# Altium footprint library Package_SO.PcbLib: 333 footprints (part 6 of 21)
Each footprint in its own frame and in the unit in brackets; x right, y up, seen from the top. Pads: shape width x height; smd on the part's side, far side on the other; paste and mask are expansions set on the pad; w line width, h text height; cw(c..) or ccw(c..) is an arc to the next point about the centre after c.
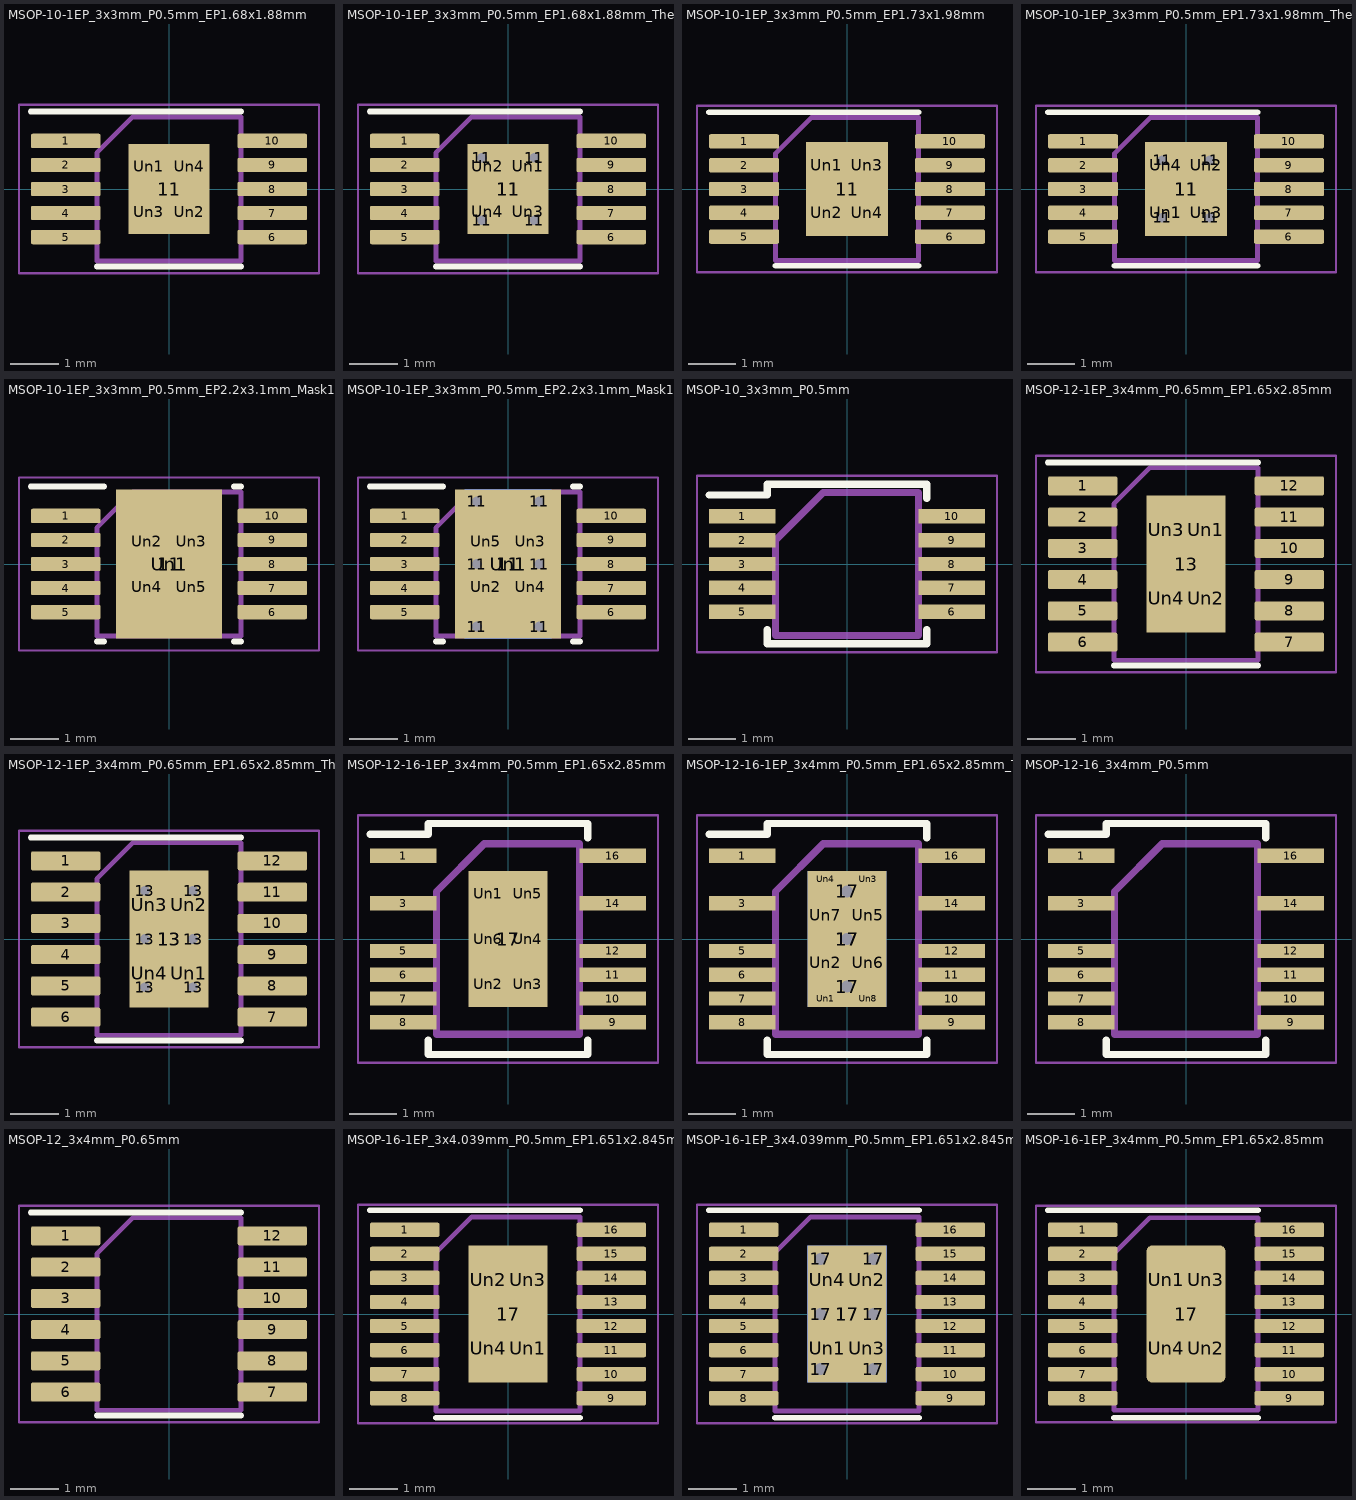
[diagram p5: the footprints below, top view; thin cyan lines are the x and y axes]

## MSOP-10-1EP_3x3mm_P0.5mm_EP1.68x1.88mm [mm]
pads (15):
  rrect25% 1.45x0.3 smd: 1(-2.15,1) 2(-2.15,0.5) 3(-2.15,0) 4(-2.15,-0.5) 5(-2.15,-1) 6(2.15,-1) 7(2.15,-0.5) 8(2.15,0) 9(2.15,0.5) 10(2.15,1)
  rect 1.68x1.88 smd: 11(0,0)
  rrect25% 0.68x0.76 on Top Paste: Un1(-0.42,0.47) Un2(0.42,-0.47) Un3(-0.42,-0.47) Un4(0.42,0.47)
F.SilkS:
  lines w0.12: -2.875,1.61 0,1.61 1.5,1.61 ; -1.5,-1.61 0,-1.61 1.5,-1.61
F.CrtYd:
  lines w0.05: -3.12,-1.75 -3.12,1.75 3.12,1.75 3.12,-1.75 -3.12,-1.75
F.Fab:
  lines w0.1: -1.5,-1.5 -1.5,0.75 -0.75,1.5 1.5,1.5 1.5,-1.5 -1.5,-1.5
  text "'.Designator'" at -3.033,-0.628 h0.75

## MSOP-10-1EP_3x3mm_P0.5mm_EP1.68x1.88mm_ThermalVias [mm]
pads (20):
  rrect25% 1.45x0.3 smd: 1(-2.15,1) 2(-2.15,0.5) 3(-2.15,0) 4(-2.15,-0.5) 5(-2.15,-1) 6(2.15,-1) 7(2.15,-0.5) 8(2.15,0) 9(2.15,0.5) 10(2.15,1)
  round 0.5 hole 0.2: 11(-0.55,-0.65) 11(-0.55,0.65) 11(0.55,-0.65) 11(0.55,0.65)
  rect 1.68x1.88 smd: 11(0,0)
  rect 1.6x1.8 smd far side: 11(0,0)
  rrect25% 0.7x0.79 on Top Paste: Un1(0.42,0.47) Un2(-0.42,0.47) Un3(0.42,-0.47) Un4(-0.42,-0.47)
F.SilkS:
  lines w0.12: -2.875,1.61 0,1.61 1.5,1.61 ; -1.5,-1.61 0,-1.61 1.5,-1.61
F.CrtYd:
  lines w0.05: -3.12,-1.75 3.12,-1.75 3.12,1.75 -3.12,1.75 -3.12,-1.75
F.Fab:
  lines w0.1: -1.5,-1.5 1.5,-1.5 1.5,1.5 -0.75,1.5 -1.5,0.75 -1.5,-1.5
  text "'.Designator'" at -3.033,-0.628 h0.75

## MSOP-10-1EP_3x3mm_P0.5mm_EP1.73x1.98mm [mm]
pads (15):
  rrect25% 1.475x0.3 smd: 1(-2.163,1) 2(-2.163,0.5) 3(-2.163,0) 4(-2.163,-0.5) 5(-2.163,-1) 6(2.163,-1) 7(2.163,-0.5) 8(2.163,0) 9(2.163,0.5) 10(2.163,1)
  rect 1.73x1.98 smd: 11(0,0)
  rrect25% 0.7x0.8 on Top Paste: Un1(-0.43,0.495) Un2(-0.43,-0.495) Un3(0.43,0.495) Un4(0.43,-0.495)
F.SilkS:
  lines w0.12: -2.9,1.61 0,1.61 1.5,1.61 ; -1.5,-1.61 0,-1.61 1.5,-1.61
F.CrtYd:
  lines w0.05: -3.15,-1.75 3.15,-1.75 3.15,1.75 -3.15,1.75 -3.15,-1.75
F.Fab:
  lines w0.1: -1.5,-1.5 1.5,-1.5 1.5,1.5 -0.75,1.5 -1.5,0.75 -1.5,-1.5
  text "'.Designator'" at -3.033,-0.628 h0.75

## MSOP-10-1EP_3x3mm_P0.5mm_EP1.73x1.98mm_ThermalVias [mm]
pads (20):
  rrect25% 1.475x0.3 smd: 1(-2.163,1) 2(-2.163,0.5) 3(-2.163,0) 4(-2.163,-0.5) 5(-2.163,-1) 6(2.163,-1) 7(2.163,-0.5) 8(2.163,0) 9(2.163,0.5) 10(2.163,1)
  round 0.5 hole 0.2: 11(-0.5,-0.6) 11(-0.5,0.6) 11(0.5,-0.6) 11(0.5,0.6)
  rect 1.5x1.7 smd far side: 11(0,0)
  rect 1.73x1.98 smd: 11(0,0)
  rrect25% 0.72x0.83 on Top Paste: Un1(-0.43,-0.495) Un2(0.43,0.495) Un3(0.43,-0.495) Un4(-0.43,0.495)
F.SilkS:
  lines w0.12: -2.9,1.61 0,1.61 1.5,1.61 ; -1.5,-1.61 0,-1.61 1.5,-1.61
F.CrtYd:
  lines w0.05: -3.15,-1.75 -3.15,1.75 3.15,1.75 3.15,-1.75 -3.15,-1.75
F.Fab:
  lines w0.1: -1.5,-1.5 1.5,-1.5 1.5,1.5 -0.75,1.5 -1.5,0.75 -1.5,-1.5
  text "'.Designator'" at -3.033,-0.628 h0.75

## MSOP-10-1EP_3x3mm_P0.5mm_EP2.2x3.1mm_Mask1.83x1.89mm [mm]
pads (16):
  rrect25% 1.45x0.3 smd: 1(-2.15,1) 2(-2.15,0.5) 3(-2.15,0) 4(-2.15,-0.5) 5(-2.15,-1) 6(2.15,-1) 7(2.15,-0.5) 8(2.15,0) 9(2.15,0.5) 10(2.15,1)
  rect 2.2x3.1 smd: 11(0,0)
  rect 1.83x1.89 on Top Solder: Un1(0,0)
  rrect25% 0.74x0.76 on Top Paste: Un2(-0.46,0.47) Un3(0.46,0.47) Un4(-0.46,-0.47) Un5(0.46,-0.47)
F.SilkS:
  lines w0.12: -2.875,1.61 -1.353,1.61 ; -1.5,-1.61 -1.353,-1.61 ; 1.353,-1.61 1.5,-1.61 ; 1.353,1.61 1.5,1.61
F.CrtYd:
  lines w0.05: -3.12,-1.8 -3.12,1.8 3.12,1.8 3.12,-1.8 -3.12,-1.8
F.Fab:
  lines w0.1: -1.5,-1.5 1.5,-1.5 1.5,1.5 -0.75,1.5 -1.5,0.75 -1.5,-1.5
  text "'.Designator'" at -3.033,-0.628 h0.75

## MSOP-10-1EP_3x3mm_P0.5mm_EP2.2x3.1mm_Mask1.83x1.89mm_ThermalVias [mm]
pads (23):
  rrect25% 1.45x0.3 smd: 1(-2.15,1) 2(-2.15,0.5) 3(-2.15,0) 4(-2.15,-0.5) 5(-2.15,-1) 6(2.15,-1) 7(2.15,-0.5) 8(2.15,0) 9(2.15,0.5) 10(2.15,1)
  round 0.5 hole 0.2: 11(-0.65,-1.3) 11(-0.65,0) 11(-0.65,1.3) 11(0.65,-1.3) 11(0.65,0) 11(0.65,1.3)
  rect 1.8x3.1 smd far side: 11(0,0)
  rect 2.2x3.1 smd: 11(0,0)
  rect 1.83x1.89 on Top Solder: Un1(0,0)
  rrect25% 0.74x0.76 on Top Paste: Un2(-0.46,-0.47) Un3(0.46,0.47) Un4(0.46,-0.47) Un5(-0.46,0.47)
F.SilkS:
  lines w0.12: -2.875,1.61 -1.353,1.61 ; -1.5,-1.61 -1.353,-1.61 ; 1.353,-1.61 1.5,-1.61 ; 1.353,1.61 1.5,1.61
F.CrtYd:
  lines w0.05: -3.12,-1.8 3.12,-1.8 3.12,1.8 -3.12,1.8 -3.12,-1.8
F.Fab:
  lines w0.1: -1.5,-1.5 -1.5,0.75 -0.75,1.5 1.5,1.5 1.5,-1.5 -1.5,-1.5
  text "'.Designator'" at -3.033,-0.628 h0.75

## MSOP-10_3x3mm_P0.5mm [mm]
pads (10):
  rect 1.4x0.3 smd: 1(-2.2,1) 2(-2.2,0.5) 3(-2.2,0) 4(-2.2,-0.5) 5(-2.2,-1) 6(2.2,-1) 7(2.2,-0.5) 8(2.2,0) 9(2.2,0.5) 10(2.2,1)
F.SilkS:
  lines w0.15: -2.9,1.45 -1.675,1.45 -1.675,1.675 1.675,1.675 1.675,1.375 ; -1.675,-1.375 -1.675,-1.675 1.675,-1.675 1.675,-1.375
F.CrtYd:
  lines w0.05: -3.15,-1.85 -3.15,1.85 3.15,1.85 3.15,-1.85 -3.15,-1.85
F.Fab:
  lines w0.15: -1.5,-1.5 1.5,-1.5 1.5,1.5 -0.5,1.5 -1.5,0.5 -1.5,-1.5
  text "'.Designator'" at -2.488,-0.564 h0.6

## MSOP-12-1EP_3x4mm_P0.65mm_EP1.65x2.85mm [mm]
pads (17):
  rrect25% 1.45x0.4 smd: 1(-2.15,1.625) 2(-2.15,0.975) 3(-2.15,0.325) 4(-2.15,-0.325) 5(-2.15,-0.975) 6(-2.15,-1.625) 7(2.15,-1.625) 8(2.15,-0.975) 9(2.15,-0.325) 10(2.15,0.325) 11(2.15,0.975) 12(2.15,1.625)
  rect 1.65x2.85 smd: 13(0,0)
  rrect25% 0.67x1.15 on Top Paste: Un1(0.41,0.71) Un2(0.41,-0.71) Un3(-0.41,0.71) Un4(-0.41,-0.71)
F.SilkS:
  lines w0.12: -2.875,2.11 0,2.11 1.5,2.11 ; -1.5,-2.11 0,-2.11 1.5,-2.11
F.CrtYd:
  lines w0.05: -3.12,-2.25 3.12,-2.25 3.12,2.25 -3.12,2.25 -3.12,-2.25
F.Fab:
  lines w0.1: -1.5,-2 1.5,-2 1.5,2 -0.75,2 -1.5,1.25 -1.5,-2
  text "'.Designator'" at -3.033,-0.628 h0.75

## MSOP-12-1EP_3x4mm_P0.65mm_EP1.65x2.85mm_ThermalVias [mm]
pads (24):
  rrect25% 1.45x0.4 smd: 1(-2.15,1.625) 2(-2.15,0.975) 3(-2.15,0.325) 4(-2.15,-0.325) 5(-2.15,-0.975) 6(-2.15,-1.625) 7(2.15,-1.625) 8(2.15,-0.975) 9(2.15,-0.325) 10(2.15,0.325) 11(2.15,0.975) 12(2.15,1.625)
  round 0.5 hole 0.2: 13(-0.5,-1) 13(-0.5,0) 13(-0.5,1) 13(0.5,-1) 13(0.5,0) 13(0.5,1)
  rect 1.5x2.5 smd far side: 13(0,0)
  rect 1.65x2.85 smd: 13(0,0)
  rrect25% 0.69x1.19 on Top Paste: Un1(0.41,-0.71) Un2(0.41,0.71) Un3(-0.41,0.71) Un4(-0.41,-0.71)
F.SilkS:
  lines w0.12: -2.875,2.11 0,2.11 1.5,2.11 ; -1.5,-2.11 0,-2.11 1.5,-2.11
F.CrtYd:
  lines w0.05: -3.12,-2.25 3.12,-2.25 3.12,2.25 -3.12,2.25 -3.12,-2.25
F.Fab:
  lines w0.1: -1.5,-2 1.5,-2 1.5,2 -0.75,2 -1.5,1.25 -1.5,-2
  text "'.Designator'" at -3.033,-0.628 h0.75

## MSOP-12-16-1EP_3x4mm_P0.5mm_EP1.65x2.85mm [mm]
pads (19):
  rect 1.4x0.3 smd: 1(-2.2,1.75) 3(-2.2,0.75) 5(-2.2,-0.25) 6(-2.2,-0.75) 7(-2.2,-1.25) 8(-2.2,-1.75) 9(2.2,-1.75) 10(2.2,-1.25) 11(2.2,-0.75) 12(2.2,-0.25) 14(2.2,0.75) 16(2.2,1.75)
  rect 1.65x2.85 smd: 17(0,0)
  rect 0.66x0.75 on Top Paste: Un1(-0.413,0.95) Un2(-0.413,-0.95) Un3(0.413,-0.95) Un4(0.413,0) Un5(0.413,0.95) Un6(-0.413,0)
F.SilkS:
  lines w0.15: -2.9,2.2 -1.675,2.2 -1.675,2.425 1.675,2.425 1.675,2.125 ; -1.675,-2.125 -1.675,-2.425 1.675,-2.425 1.675,-2.125
F.CrtYd:
  lines w0.05: -3.15,-2.6 -3.15,2.6 3.15,2.6 3.15,-2.6 -3.15,-2.6
F.Fab:
  lines w0.15: -1.5,-2 -1.5,1 -0.5,2 1.5,2 1.5,-2 -1.5,-2
  text "'.Designator'" at -2.428,-0.504 h0.6

## MSOP-12-16-1EP_3x4mm_P0.5mm_EP1.65x2.85mm_ThermalVias [mm]
pads (25):
  rect 1.4x0.3 smd: 1(-2.2,1.75) 3(-2.2,0.75) 5(-2.2,-0.25) 6(-2.2,-0.75) 7(-2.2,-1.25) 8(-2.2,-1.75) 9(2.2,-1.75) 10(2.2,-1.25) 11(2.2,-0.75) 12(2.2,-0.25) 14(2.2,0.75) 16(2.2,1.75)
  round 0.65 hole 0.25: 17(0,-1) 17(0,0) 17(0,1)
  rect 1.65x2.85 smd far side: 17(0,0)
  rect 1.65x2.85 smd: 17(0,0)
  rect 0.65x0.25 on Top Paste: Un1(-0.45,-1.25) Un3(0.45,1.25) Un4(-0.45,1.25) Un8(0.45,-1.25)
  rect 0.65x0.8 on Top Paste: Un2(-0.45,-0.5) Un5(0.45,0.5) Un6(0.45,-0.5) Un7(-0.45,0.5)
F.SilkS:
  lines w0.15: -2.9,2.2 -1.675,2.2 -1.675,2.425 1.675,2.425 1.675,2.125 ; -1.675,-2.125 -1.675,-2.425 1.675,-2.425 1.675,-2.125
F.CrtYd:
  lines w0.05: -3.15,-2.6 3.15,-2.6 3.15,2.6 -3.15,2.6 -3.15,-2.6
F.Fab:
  lines w0.15: -1.5,-2 1.5,-2 1.5,2 -0.5,2 -1.5,1 -1.5,-2
  text "'.Designator'" at -2.428,-0.504 h0.6

## MSOP-12-16_3x4mm_P0.5mm [mm]
pads (12):
  rect 1.4x0.3 smd: 1(-2.2,1.75) 3(-2.2,0.75) 5(-2.2,-0.25) 6(-2.2,-0.75) 7(-2.2,-1.25) 8(-2.2,-1.75) 9(2.2,-1.75) 10(2.2,-1.25) 11(2.2,-0.75) 12(2.2,-0.25) 14(2.2,0.75) 16(2.2,1.75)
F.SilkS:
  lines w0.15: -2.9,2.2 -1.675,2.2 -1.675,2.425 1.675,2.425 1.675,2.125 ; -1.675,-2.125 -1.675,-2.425 1.675,-2.425 1.675,-2.125
F.CrtYd:
  lines w0.05: -3.15,-2.6 -3.15,2.6 3.15,2.6 3.15,-2.6 -3.15,-2.6
F.Fab:
  lines w0.15: -1.5,-2 -1.5,1 -0.5,2 1.5,2 1.5,-2 -1.5,-2
  text "'.Designator'" at -2.488,-0.564 h0.6

## MSOP-12_3x4mm_P0.65mm [mm]
pads (12):
  rrect25% 1.45x0.4 smd: 1(-2.15,1.625) 2(-2.15,0.975) 3(-2.15,0.325) 4(-2.15,-0.325) 5(-2.15,-0.975) 6(-2.15,-1.625) 7(2.15,-1.625) 8(2.15,-0.975) 9(2.15,-0.325) 10(2.15,0.325) 11(2.15,0.975) 12(2.15,1.625)
F.SilkS:
  lines w0.12: -2.875,2.11 0,2.11 1.5,2.11 ; -1.5,-2.11 0,-2.11 1.5,-2.11
F.CrtYd:
  lines w0.05: -3.12,-2.25 3.12,-2.25 3.12,2.25 -3.12,2.25 -3.12,-2.25
F.Fab:
  lines w0.1: -1.5,-2 1.5,-2 1.5,2 -0.75,2 -1.5,1.25 -1.5,-2
  text "'.Designator'" at -3.033,-0.628 h0.75

## MSOP-16-1EP_3x4.039mm_P0.5mm_EP1.651x2.845mm [mm]
pads (21):
  rrect25% 1.45x0.3 smd: 1(-2.15,1.75) 2(-2.15,1.25) 3(-2.15,0.75) 4(-2.15,0.25) 5(-2.15,-0.25) 6(-2.15,-0.75) 7(-2.15,-1.25) 8(-2.15,-1.75) 9(2.15,-1.75) 10(2.15,-1.25) 11(2.15,-0.75) 12(2.15,-0.25) 13(2.15,0.25) 14(2.15,0.75) 15(2.15,1.25) 16(2.15,1.75)
  rect 1.651x2.845 smd: 17(0,0)
  rrect25% 0.69x1.19 on Top Paste: Un1(0.415,-0.71) Un2(-0.415,0.71) Un3(0.415,0.71) Un4(-0.415,-0.71)
F.SilkS:
  lines w0.12: -2.875,2.16 0,2.16 1.5,2.16 ; -1.5,-2.16 0,-2.16 1.5,-2.16
F.CrtYd:
  lines w0.05: -3.12,-2.27 3.12,-2.27 3.12,2.27 -3.12,2.27 -3.12,-2.27
F.Fab:
  lines w0.1: -1.5,-2.02 1.5,-2.02 1.5,2.02 -0.75,2.02 -1.5,1.269 -1.5,-2.02
  text "'.Designator'" at -3.033,-0.628 h0.75

## MSOP-16-1EP_3x4.039mm_P0.5mm_EP1.651x2.845mm_ThermalVias [mm]
pads (28):
  rrect25% 1.45x0.3 smd: 1(-2.15,1.75) 2(-2.15,1.25) 3(-2.15,0.75) 4(-2.15,0.25) 5(-2.15,-0.25) 6(-2.15,-0.75) 7(-2.15,-1.25) 8(-2.15,-1.75) 9(2.15,-1.75) 10(2.15,-1.25) 11(2.15,-0.75) 12(2.15,-0.25) 13(2.15,0.25) 14(2.15,0.75) 15(2.15,1.25) 16(2.15,1.75)
  round 0.55 hole 0.25: 17(-0.55,-1.148) 17(-0.55,0) 17(-0.55,1.148) 17(0.55,-1.148) 17(0.55,0) 17(0.55,1.148)
  rect 1.651x2.845 smd: 17(0,0)
  rect 1.651x2.845 smd far side: 17(0,0)
  rrect25% 0.69x1.19 on Top Paste: Un1(-0.415,-0.71) Un2(0.415,0.71) Un3(0.415,-0.71) Un4(-0.415,0.71)
F.SilkS:
  lines w0.12: -2.875,2.16 0,2.16 1.5,2.16 ; -1.5,-2.16 0,-2.16 1.5,-2.16
F.CrtYd:
  lines w0.05: -3.12,-2.27 3.12,-2.27 3.12,2.27 -3.12,2.27 -3.12,-2.27
F.Fab:
  lines w0.1: -1.5,-2.02 1.5,-2.02 1.5,2.02 -0.75,2.02 -1.5,1.269 -1.5,-2.02
  text "'.Designator'" at -3.033,-0.628 h0.75

## MSOP-16-1EP_3x4mm_P0.5mm_EP1.65x2.85mm [mm]
pads (21):
  rrect25% 1.45x0.3 smd: 1(-2.15,1.75) 2(-2.15,1.25) 3(-2.15,0.75) 4(-2.15,0.25) 5(-2.15,-0.25) 6(-2.15,-0.75) 7(-2.15,-1.25) 8(-2.15,-1.75) 9(2.15,-1.75) 10(2.15,-1.25) 11(2.15,-0.75) 12(2.15,-0.25) 13(2.15,0.25) 14(2.15,0.75) 15(2.15,1.25) 16(2.15,1.75)
  rrect15% 1.65x2.85 smd: 17(0,0)
  rrect25% 0.67x1.15 on Top Paste: Un1(-0.41,0.71) Un2(0.41,-0.71) Un3(0.41,0.71) Un4(-0.41,-0.71)
F.SilkS:
  lines w0.12: -2.875,2.16 0,2.16 1.5,2.16 ; -1.5,-2.16 0,-2.16 1.5,-2.16
F.CrtYd:
  lines w0.05: -3.12,-2.25 3.12,-2.25 3.12,2.25 -3.12,2.25 -3.12,-2.25
F.Fab:
  lines w0.1: -1.5,-2 1.5,-2 1.5,2 -0.75,2 -1.5,1.25 -1.5,-2
  text "'.Designator'" at -3.033,-0.628 h0.75